# Altium footprint library mobinbyn-IC.PcbLib: 41 footprints (part 3 of 3)
Each footprint in its own frame and in the unit in brackets; x right, y up, seen from the top. Pads: shape width x height; smd on the part's side, far side on the other; paste and mask are expansions set on the pad; w line width, h text height; cw(c..) or ccw(c..) is an arc to the next point about the centre after c.
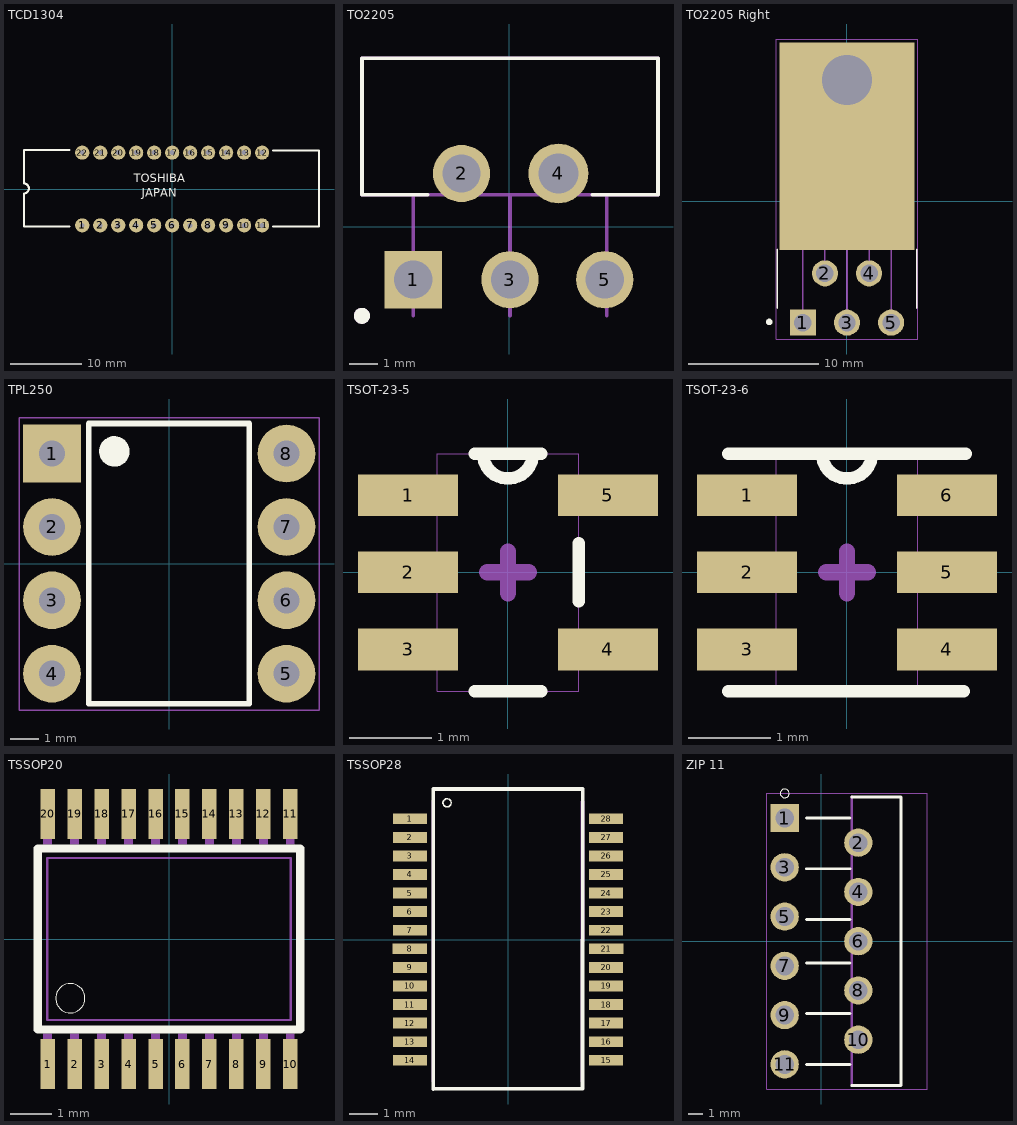
[diagram p2: the footprints below, top view; thin cyan lines are the x and y axes]

## TCD1304 [mm] "TOSHIBA CCR"
pads (22):
  round 2 hole 0.7: 1(-12.7,-5.13) 2(-10.16,-5.13) 3(-7.62,-5.13) 4(-5.08,-5.13) 5(-2.54,-5.13) 6(0,-5.13) 7(2.54,-5.13) 8(5.08,-5.13) 9(7.62,-5.13) 10(10.16,-5.13) 11(12.7,-5.13) 12(12.7,5.13) 13(10.16,5.13) 14(7.62,5.13) 15(5.08,5.13) 16(2.54,5.13) 17(0,5.13) 18(-2.54,5.13) 19(-5.08,5.13) 20(-7.62,5.13) 21(-10.16,5.13) 22(-12.7,5.13)
Top Overlay:
  lines w0.3: -14.503,-5.282 -20.93,-5.282 -20.93,-0.623 ccw(c-20.93,0.077) -20.93,0.777 -20.93,5.513 -14.503,5.513 ; 14.224,-5.282 20.726,-5.282 20.726,5.462 14.224,5.462
  text "TOSHIBA" at -5.436,0.534 h2
  text "JAPAN" at -4.293,-1.549 h2
3D body "User Library-TCD1304.step": height 3.52, standoff -3.71, extent -20.825,-5.303 20.775,5.457

## TO2205 [mm]
pads (5):
  rect 2.01x2.01 hole 1.34: 1(-3.365,-1.865)
  round 2.01 hole 1.34: 2(-1.666,1.865) 3(0.035,-1.865) 5(3.365,-1.865)
  round 2.1 hole 1.4: 4(1.734,1.865)
Top Overlay:
  circle w0.28: c-5.165,-3.135 r0.14
  lines w0.127: -2.866,1.115 -5.165,1.115 -5.165,5.915 5.235,5.915 5.235,1.115 2.935,1.115
Mechanical 13:
  circle w0.28: c-5.165,-3.135 r0.14
  lines w0.127: -3.365,-3.135 -3.365,1.115 ; 0.035,-3.135 0.035,1.115 ; 3.434,-3.135 3.434,1.115 ; -3.365,1.115 -5.165,1.115 -5.165,5.915 5.235,5.915 5.235,1.115 3.434,1.115 ; -3.365,1.115 0.035,1.115 ; 0.035,1.115 3.434,1.115
3D body "User Library-TO220-5.STEP": height 21.59, standoff -2.4, extent -5.017,-2.119 5.143,6.121

## TO2205 Right [mm]
pads (7):
  rect 2.01x2.01 hole 1.34: 1(-3.4,-9.35)
  round 2.01 hole 1.34: 2(-1.7,-5.55) 3(0,-9.35) 4(1.7,-5.55) 5(3.4,-9.35)
  rect 10.4x15.99 smd: ""(0,4.243)
  round 4.866 hole 3.85: ""(0,9.35)
Top Overlay:
  circle w0.3: c-5.992,-9.296 r0.1
  lines w0.127: -5.38,-8.23 -5.38,-3.69 ; 5.38,-8.23 5.38,-3.69
Mechanical 13:
  lines w0.127: -3.4,-8.34 -3.4,-3.45 ; -1.7,-4.54 -1.7,-3.45 ; 0,-8.34 0,-3.45 ; 1.7,-4.54 1.7,-3.45 ; 3.4,-8.34 3.4,-3.45
Mechanical 15:
  lines w0.05: -5.45,-10.608 5.45,-10.608 5.45,12.493 -5.45,12.493 -5.45,-10.608
3D body "TO2205 Right.step": height 5.81, standoff -5.09, extent -5.164,-9.731 5.236,12.494

## TPL250 [mm]
pads (8):
  rect 2x2 hole 0.9: 1(-4.06,3.81)
  round 2 hole 0.9: 2(-4.06,1.27) 3(-4.06,-1.27) 4(-4.06,-3.81) 5(4.06,-3.81) 6(4.06,-1.27) 7(4.06,1.27) 8(4.06,3.81)
Top Overlay:
  circle w0.254: c-1.901,3.886 r0.403
  region: -2.29,3.9 -2.29,3.91 -2.288,3.931 -2.286,3.952 -2.283,3.973 -2.279,3.993 -2.273,4.014 -2.267,4.034 -2.259,4.053 -2.251,4.072 -2.241,4.091 -2.231,4.109 -2.219,4.127 -2.207,4.144 -2.194,4.16 -2.18,4.175 -2.165,4.19 -2.149,4.204 -2.133,4.217 -2.116,4.23 -2.099,4.241 -2.081,4.252 -2.062,4.261 -2.043,4.27 -2.023,4.277 -2.003,4.284 -1.983,4.289 -1.963,4.293 -1.942,4.297 -1.921,4.299 -1.9,4.3 -1.89,4.3 -1.879,4.3 -1.858,4.299 -1.837,4.297 -1.817,4.293 -1.796,4.289 -1.776,4.284 -1.756,4.277 -1.736,4.27 -1.717,4.261 -1.699,4.252 -1.681,4.241 -1.663,4.23 -1.646,4.217 -1.63,4.204 -1.614,4.19 -1.599,4.175 -1.585,4.16 -1.572,4.144 -1.56,4.127 -1.548,4.109 -1.538,4.091 -1.528,4.072 -1.52,4.053 -1.512,4.034 -1.506,4.014 -1.501,3.993 -1.496,3.973 -1.493,3.952 -1.491,3.931 -1.49,3.91 -1.49,3.9 -1.49,3.89 -1.491,3.869 -1.493,3.848 -1.496,3.827 -1.501,3.807 -1.506,3.786 -1.512,3.766 -1.52,3.747 -1.528,3.728 -1.538,3.709 -1.548,3.691 -1.56,3.673 -1.572,3.656 -1.585,3.64 -1.599,3.625 -1.614,3.61 -1.63,3.596 -1.646,3.583 -1.663,3.57 -1.681,3.559 -1.699,3.548 -1.717,3.539 -1.736,3.53 -1.756,3.523 -1.776,3.516 -1.796,3.511 -1.817,3.507 -1.837,3.503 -1.858,3.501 -1.879,3.5 -1.89,3.5 -1.9,3.5 -1.921,3.501 -1.942,3.503 -1.963,3.507 -1.983,3.511 -2.003,3.516 -2.023,3.523 -2.043,3.53 -2.062,3.539 -2.081,3.548 -2.099,3.559 -2.116,3.57 -2.133,3.583 -2.149,3.596 -2.165,3.61 -2.18,3.625 -2.194,3.64 -2.207,3.656 -2.219,3.673 -2.231,3.691 -2.241,3.709 -2.251,3.728 -2.259,3.747 -2.267,3.766 -2.273,3.786 -2.279,3.807 -2.283,3.827 -2.286,3.848 -2.288,3.869 -2.29,3.89
  lines w0.05: -1.442,3.9 cw(c-1.89,3.9) -1.443,3.919
  lines w0.2: -2.79,-4.85 -2.79,4.85 2.773,4.85 2.773,-4.85 -2.79,-4.85
Mechanical 1:
  lines w0.05: -5.203,-5.08 -5.203,5.055 5.186,5.055 5.186,-5.08 -5.203,-5.08
3D body "User Library-8-pin-dip.step": height 4.05, standoff -3.31, extent -4.196,-4.956 4.186,4.95

## TSOT-23-5 [mil]
pads (5):
  rect 48x20 smd: 1(-48,37) 2(-48,0) 3(-48,-37) 4(48,-37) 5(48,37)
Top Overlay:
  lines w6: -16,-57 16,-57 ; -16,57 -12,57 ; 16,57 12,57 ; 34,-14 34,14 ; -12,57 ccw(c0,57) 12,57 ; -12,57 12,57
Mechanical 1:
  lines w0: -34,-46 -34,-57 34,-57 34,-46 ; -34,-46 -34,-29 ; -34,-46 -55,-46 -55,-29 -34,-29 ; -34,-29 -34,-9 ; -34,-9 -34,9 ; -34,-9 -55,-9 -55,9 -34,9 ; -34,9 -34,29 ; -34,29 -34,46 ; -34,29 -55,29 -55,46 -34,46 ; -34,46 -34,57 -12,57 ; -12,57 ccw(c0,57) 12,57 ; -12,57 12,57 ; 12,57 34,57 34,46 ; 34,-46 34,-29 ; 34,-46 55,-46 55,-29 34,-29 ; 34,-29 34,29 ; 34,29 34,46 ; 34,29 55,29 55,46 34,46
Mechanical 15:
  lines w7.87: -10,0 0,0 ; 0,-10 0,0 ; 0,10 0,0 ; 10,0 0,0
3D body "User Library-DDC (R-PDSO-G5).STEP": height 43.31, standoff 0, extent -63.95,-60.04 63.96,60.04

## TSOT-23-6 [mil]
pads (6):
  rect 48x20 smd: 1(-48,37) 2(-48,0) 3(-48,-37) 4(48,-37) 5(48,0) 6(48,37)
Top Overlay:
  lines w6: -57,-57 56,-57 ; -57,57 -12,57 ; 57,57 12,57 ; -12,57 ccw(c0,57) 12,57 ; -12,57 12,57
Mechanical 1:
  lines w0: -34,-46 -34,-57 34,-57 34,-46 ; -34,-46 -34,-29 ; -34,-46 -55,-46 -55,-29 -34,-29 ; -34,-29 -34,-9 ; -34,-9 -34,9 ; -34,-9 -55,-9 -55,9 -34,9 ; -34,9 -34,29 ; -34,29 -34,46 ; -34,29 -55,29 -55,46 -34,46 ; -34,46 -34,57 -12,57 ; -12,57 ccw(c0,57) 12,57 ; -12,57 12,57 ; 12,57 34,57 34,46 ; 34,-46 34,-29 ; 34,-46 55,-46 55,-29 34,-29 ; 34,-29 34,29 ; 34,29 34,46 ; 34,29 55,29 55,46 34,46
Mechanical 15:
  lines w7.87: -10,0 0,0 ; 0,-10 0,0 ; 0,10 0,0 ; 10,0 0,0
3D body "User Library-TSOT-23-6(S6).step": height 39.37, standoff 0, extent -55.6,-57.09 55.6,57.09

## TSSOP20 [mm]
pads (20):
  rect 0.35x1.2 smd: 1(-2.925,-3.018) 2(-2.275,-3.018) 3(-1.625,-3.018) 4(-0.975,-3.018) 5(-0.325,-3.018) 6(0.325,-3.018) 7(0.975,-3.018) 8(1.625,-3.018) 9(2.275,-3.018) 10(2.925,-3.018) 11(2.925,3.018) 12(2.275,3.018) 13(1.625,3.018) 14(0.975,3.018) 15(0.325,3.018) 16(-0.325,3.018) 17(-0.975,3.018) 18(-1.625,3.018) 19(-2.275,3.018) 20(-2.925,3.018)
Top Overlay:
  circle w0: c-2.381,-1.429 r0.355
  lines w0.203: -3.165,-2.183 -3.165,2.183 3.165,2.183 3.165,-2.183 -3.165,-2.183
Mechanical 1:
  region: -3.03,3.3 -2.823,3.3 -2.823,2.285 -3.03,2.285
  region: -2.377,3.3 -2.173,3.3 -2.173,2.283 -2.377,2.283
  region: -1.729,3.3 -1.523,3.3 -1.523,2.287 -1.729,2.287
  region: -1.079,3.3 -0.873,3.3 -0.873,2.287 -1.079,2.287
  region: -0.427,3.3 -0.223,3.3 -0.223,2.284 -0.427,2.284
  region: 0.224,3.3 0.427,3.3 0.427,2.286 0.224,2.286
  region: 0.875,3.3 1.077,3.3 1.077,2.286 0.875,2.286
  region: 1.526,3.3 1.727,3.3 1.727,2.286 1.526,2.286
  region: 2.176,3.3 2.377,3.3 2.377,2.286 2.176,2.286
  region: 2.827,3.3 3.027,3.3 3.027,2.285 2.827,2.285
  region: 2.825,-2.283 3.027,-2.283 3.027,-3.301 2.825,-3.301
  region: 2.174,-2.283 2.377,-2.283 2.377,-3.301 2.174,-3.301
  region: 1.523,-2.283 1.727,-2.283 1.727,-3.3 1.523,-3.3
  region: 0.875,-2.283 1.077,-2.283 1.077,-3.305 0.875,-3.305
  region: 0.224,-2.283 0.427,-2.283 0.427,-3.304 0.224,-3.304
  region: -0.427,-2.283 -0.223,-2.283 -0.223,-3.304 -0.427,-3.304
  region: -1.078,-2.283 -0.873,-2.283 -0.873,-3.306 -1.078,-3.306
  region: -1.73,-2.283 -1.523,-2.283 -1.523,-3.306 -1.73,-3.306
  region: -2.378,-2.283 -2.173,-2.283 -2.173,-3.302 -2.378,-3.302
  region: -3.032,-2.283 -2.823,-2.283 -2.823,-3.306 -3.032,-3.306
  lines w0.051: -2.936,-1.954 -2.936,1.954 2.936,1.954 2.936,-1.954 -2.936,-1.954
3D body "User Library-TSSOP20_TP.STEP": height 1.1, standoff -0.09, extent -3.15,-3.218 3.35,3.062

## TSSOP28 [mm]
pads (28):
  rect 1.2x0.38 smd: 1(-3.429,4.225) 2(-3.429,3.575) 3(-3.429,2.925) 4(-3.429,2.275) 5(-3.429,1.625) 6(-3.429,0.975) 7(-3.429,0.325) 8(-3.435,-0.325) 9(-3.429,-0.975) 10(-3.429,-1.625) 11(-3.429,-2.275) 12(-3.429,-2.925) 13(-3.429,-3.575) 14(-3.429,-4.225) 15(3.429,-4.225) 16(3.429,-3.575) 17(3.429,-2.925) 18(3.429,-2.275) 19(3.429,-1.625) 20(3.429,-0.975) 21(3.435,-0.325) 22(3.429,0.325) 23(3.429,0.975) 24(3.429,1.625) 25(3.429,2.275) 26(3.429,2.925) 27(3.429,3.575) 28(3.429,4.225)
Top Overlay:
  circle w0.05: c-2.134,4.784 r0.141
  lines w0.127: -2.616,-5.23 2.606,-5.22 2.611,5.266 -2.611,5.266 -2.616,-5.23
Mechanical 16:
  lines w0.127: -2.616,-4.958 -2.616,4.833 ; 2.596,-4.958 2.606,4.823
3D body "User Library-tssop28-1.STEP": height 1.95, standoff 0, extent -3.911,-5.098 3.889,5.102

## ZIP 11 [mm] "(Make www.tarahiboard.com)"
pads (11):
  rect 1.95x1.95 hole 1.3: 1(-2.54,8.5)
  round 1.95 hole 1.3: 2(2.54,6.8) 3(-2.54,5.1) 4(2.54,3.4) 5(-2.54,1.7) 6(2.54,0) 7(-2.54,-1.7) 8(2.54,-3.4) 9(-2.54,-5.1) 10(2.54,-6.8) 11(-2.54,-8.5)
Top Overlay:
  circle w0: c-2.54,10.2 r0.304
  lines w0.2: -1.04,-8.5 1.96,-8.5 ; -1.04,-5 1.96,-5 ; -1.04,-1.5 1.96,-1.5 ; -1.04,1.5 1.96,1.5 ; -1.04,5 1.96,5 ; -1.04,8.5 1.96,8.5 ; 2.09,-9.95 5.49,-9.95 5.49,9.95 2.09,9.95
Mechanical 13:
  lines w0.2: 2.09,-9.95 2.09,9.95
Mechanical 15:
  lines w0.05: -3.79,-10.2 7.31,-10.2 7.31,10.2 -3.79,10.2 -3.79,-10.2
3D body "zip 11.STEP": height 23.51, standoff -3.47, extent -2.794,-10.103 6.576,9.897